# Altium schematic symbol library Regulator_Linear.SchLib: 1538 symbols (part 3 of 9)
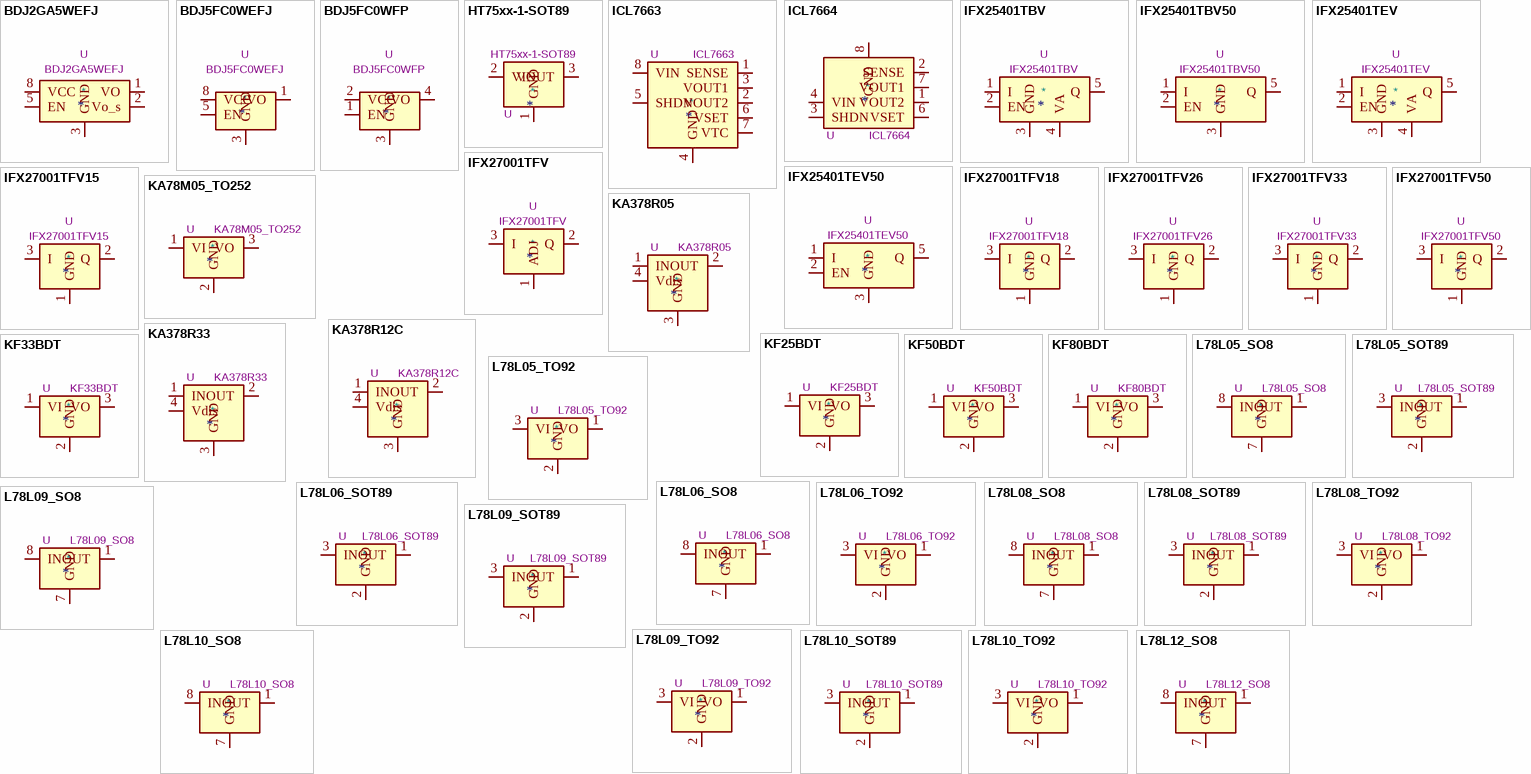
[diagram p40: symbols BDJ2GA5WEFJ to L78L12_SO8]

## L78L09_SOT89
designator *  value L78L09_SOT89  Reference: U
ki_keywords: Voltage Regulator 100mA Positive; ki_description: Positive 100mA 30V Linear Regulator, Fixed Output 9V, SOT-89; ki_fp_filters: SOT?89*; Footprint: Package_TO_SOT_SMD:SOT-89-3; Datasheet: http://www.st.com/content/ccc/resource/technical/document/datasheet/15/55/e5/aa/23/5b/43/fd/CD00000446.pdf/files/CD00000446.pdf/jcr:content/translations/en.CD00000446.pdf
pins: 1 OUT, 2 GND, 3 IN

## L78L09_TO92
designator *  value L78L09_TO92  Reference: U
ki_keywords: Voltage Regulator 100mA Positive; ki_description: Positive 100mA 30V Linear Regulator, Fixed Output 9V, TO-92; ki_fp_filters: TO?92*; Footprint: Package_TO_SOT_THT:TO-92_Inline; Datasheet: http://www.st.com/content/ccc/resource/technical/document/datasheet/15/55/e5/aa/23/5b/43/fd/CD00000446.pdf/files/CD00000446.pdf/jcr:content/translations/en.CD00000446.pdf
pins: 1 VO, 2 GND, 3 VI

## L78L10_SO8
designator *  value L78L10_SO8  Reference: U
ki_keywords: Voltage Regulator 100mA Positive; ki_description: Positive 100mA 30V Linear Regulator, Fixed Output 10V, SO-8; ki_fp_filters: SOIC*3.9x4.9mm*P1.27mm*; Footprint: Package_SO:SOIC-8_3.9x4.9mm_P1.27mm; Datasheet: http://www.st.com/content/ccc/resource/technical/document/datasheet/15/55/e5/aa/23/5b/43/fd/CD00000446.pdf/files/CD00000446.pdf/jcr:content/translations/en.CD00000446.pdf
pins: 1 OUT, 2 GND hidden, 3 GND hidden, 4 NC hidden, 5 NC hidden, 6 GND hidden, 7 GND, 8 IN

## L78L10_SOT89
designator *  value L78L10_SOT89  Reference: U
ki_keywords: Voltage Regulator 100mA Positive; ki_description: Positive 100mA 30V Linear Regulator, Fixed Output 10V, SOT-89; ki_fp_filters: SOT?89*; Footprint: Package_TO_SOT_SMD:SOT-89-3; Datasheet: http://www.st.com/content/ccc/resource/technical/document/datasheet/15/55/e5/aa/23/5b/43/fd/CD00000446.pdf/files/CD00000446.pdf/jcr:content/translations/en.CD00000446.pdf
pins: 1 OUT, 2 GND, 3 IN

## L78L10_TO92
designator *  value L78L10_TO92  Reference: U
ki_keywords: Voltage Regulator 100mA Positive; ki_description: Positive 100mA 30V Linear Regulator, Fixed Output 10V, TO-92; ki_fp_filters: TO?92*; Footprint: Package_TO_SOT_THT:TO-92_Inline; Datasheet: http://www.st.com/content/ccc/resource/technical/document/datasheet/15/55/e5/aa/23/5b/43/fd/CD00000446.pdf/files/CD00000446.pdf/jcr:content/translations/en.CD00000446.pdf
pins: 1 VO, 2 GND, 3 VI

## L78L12_SO8
designator *  value L78L12_SO8  Reference: U
ki_keywords: Voltage Regulator 100mA Positive; ki_description: Positive 100mA 30V Linear Regulator, Fixed Output 12V, SO-8; ki_fp_filters: SOIC*3.9x4.9mm*P1.27mm*; Footprint: Package_SO:SOIC-8_3.9x4.9mm_P1.27mm; Datasheet: http://www.st.com/content/ccc/resource/technical/document/datasheet/15/55/e5/aa/23/5b/43/fd/CD00000446.pdf/files/CD00000446.pdf/jcr:content/translations/en.CD00000446.pdf
pins: 1 OUT, 2 GND hidden, 3 GND hidden, 4 NC hidden, 5 NC hidden, 6 GND hidden, 7 GND, 8 IN

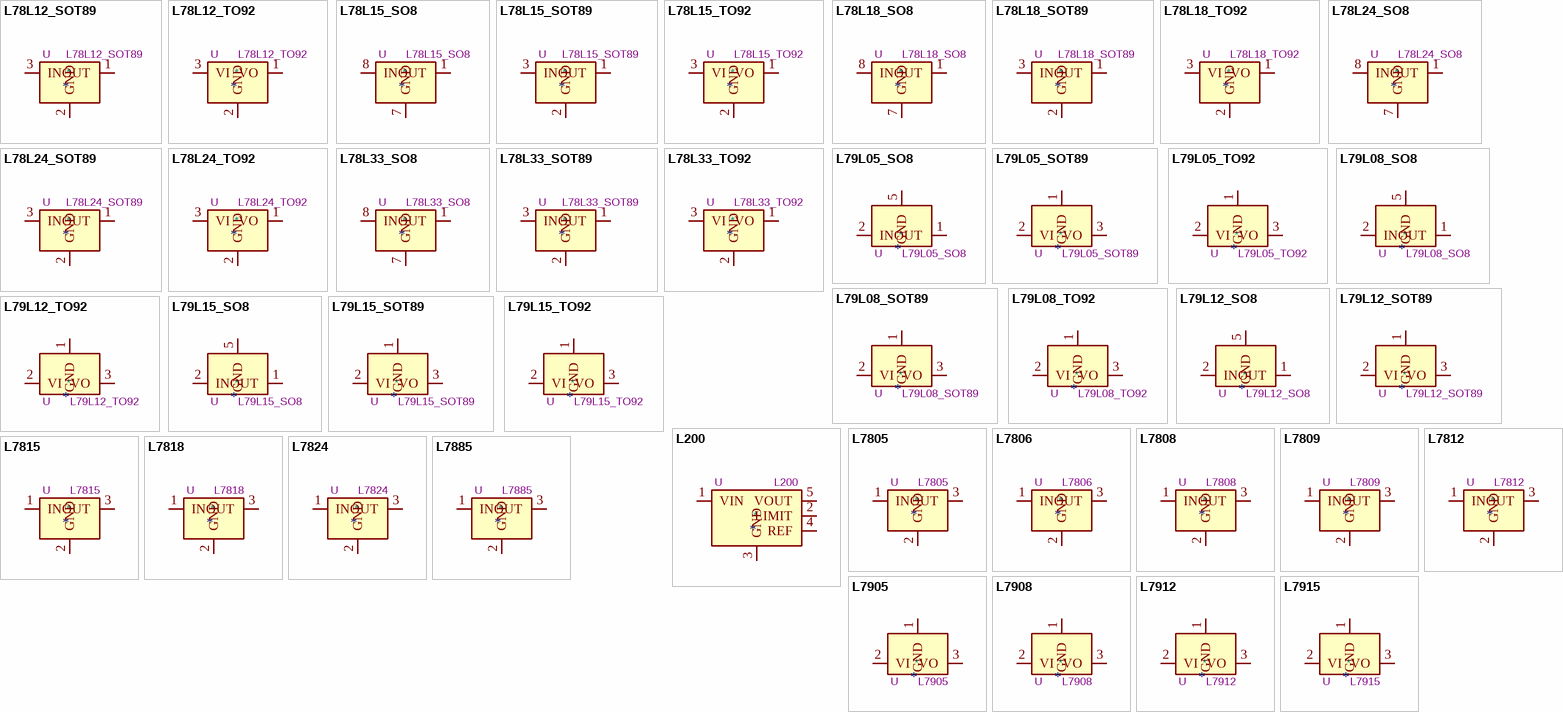
[diagram p9: symbols L78L12_SOT89 to L7915]

## L78L12_SOT89
designator *  value L78L12_SOT89  Reference: U
ki_keywords: Voltage Regulator 100mA Positive; ki_description: Positive 100mA 30V Linear Regulator, Fixed Output 12V, SOT-89; ki_fp_filters: SOT?89*; Footprint: Package_TO_SOT_SMD:SOT-89-3; Datasheet: http://www.st.com/content/ccc/resource/technical/document/datasheet/15/55/e5/aa/23/5b/43/fd/CD00000446.pdf/files/CD00000446.pdf/jcr:content/translations/en.CD00000446.pdf
pins: 1 OUT, 2 GND, 3 IN

## L78L12_TO92
designator *  value L78L12_TO92  Reference: U
ki_keywords: Voltage Regulator 100mA Positive; ki_description: Positive 100mA 30V Linear Regulator, Fixed Output 12V, TO-92; ki_fp_filters: TO?92*; Footprint: Package_TO_SOT_THT:TO-92_Inline; Datasheet: http://www.st.com/content/ccc/resource/technical/document/datasheet/15/55/e5/aa/23/5b/43/fd/CD00000446.pdf/files/CD00000446.pdf/jcr:content/translations/en.CD00000446.pdf
pins: 1 VO, 2 GND, 3 VI

## L78L15_SO8
designator *  value L78L15_SO8  Reference: U
ki_keywords: Voltage Regulator 100mA Positive; ki_description: Positive 100mA 30V Linear Regulator, Fixed Output 15V, SO-8; ki_fp_filters: SOIC*3.9x4.9mm*P1.27mm*; Footprint: Package_SO:SOIC-8_3.9x4.9mm_P1.27mm; Datasheet: http://www.st.com/content/ccc/resource/technical/document/datasheet/15/55/e5/aa/23/5b/43/fd/CD00000446.pdf/files/CD00000446.pdf/jcr:content/translations/en.CD00000446.pdf
pins: 1 OUT, 2 GND hidden, 3 GND hidden, 4 NC hidden, 5 NC hidden, 6 GND hidden, 7 GND, 8 IN

## L78L15_SOT89
designator *  value L78L15_SOT89  Reference: U
ki_keywords: Voltage Regulator 100mA Positive; ki_description: Positive 100mA 30V Linear Regulator, Fixed Output 15V, SOT-89; ki_fp_filters: SOT?89*; Footprint: Package_TO_SOT_SMD:SOT-89-3; Datasheet: http://www.st.com/content/ccc/resource/technical/document/datasheet/15/55/e5/aa/23/5b/43/fd/CD00000446.pdf/files/CD00000446.pdf/jcr:content/translations/en.CD00000446.pdf
pins: 1 OUT, 2 GND, 3 IN

## L78L15_TO92
designator *  value L78L15_TO92  Reference: U
ki_keywords: Voltage Regulator 100mA Positive; ki_description: Positive 100mA 30V Linear Regulator, Fixed Output 15V, TO-92; ki_fp_filters: TO?92*; Footprint: Package_TO_SOT_THT:TO-92_Inline; Datasheet: http://www.st.com/content/ccc/resource/technical/document/datasheet/15/55/e5/aa/23/5b/43/fd/CD00000446.pdf/files/CD00000446.pdf/jcr:content/translations/en.CD00000446.pdf
pins: 1 VO, 2 GND, 3 VI

## L78L18_SO8
designator *  value L78L18_SO8  Reference: U
ki_keywords: Voltage Regulator 100mA Positive; ki_description: Positive 100mA 30V Linear Regulator, Fixed Output 18V, SO-8; ki_fp_filters: SOIC*3.9x4.9mm*P1.27mm*; Footprint: Package_SO:SOIC-8_3.9x4.9mm_P1.27mm; Datasheet: http://www.st.com/content/ccc/resource/technical/document/datasheet/15/55/e5/aa/23/5b/43/fd/CD00000446.pdf/files/CD00000446.pdf/jcr:content/translations/en.CD00000446.pdf
pins: 1 OUT, 2 GND hidden, 3 GND hidden, 4 NC hidden, 5 NC hidden, 6 GND hidden, 7 GND, 8 IN

## L78L18_SOT89
designator *  value L78L18_SOT89  Reference: U
ki_keywords: Voltage Regulator 100mA Positive; ki_description: Positive 100mA 30V Linear Regulator, Fixed Output 18V, SOT-89; ki_fp_filters: SOT?89*; Footprint: Package_TO_SOT_SMD:SOT-89-3; Datasheet: http://www.st.com/content/ccc/resource/technical/document/datasheet/15/55/e5/aa/23/5b/43/fd/CD00000446.pdf/files/CD00000446.pdf/jcr:content/translations/en.CD00000446.pdf
pins: 1 OUT, 2 GND, 3 IN

## L78L18_TO92
designator *  value L78L18_TO92  Reference: U
ki_keywords: Voltage Regulator 100mA Positive; ki_description: Positive 100mA 30V Linear Regulator, Fixed Output 18V, TO-92; ki_fp_filters: TO?92*; Footprint: Package_TO_SOT_THT:TO-92_Inline; Datasheet: http://www.st.com/content/ccc/resource/technical/document/datasheet/15/55/e5/aa/23/5b/43/fd/CD00000446.pdf/files/CD00000446.pdf/jcr:content/translations/en.CD00000446.pdf
pins: 1 VO, 2 GND, 3 VI

## L78L24_SO8
designator *  value L78L24_SO8  Reference: U
ki_keywords: Voltage Regulator 100mA Positive; ki_description: Positive 100mA 30V Linear Regulator, Fixed Output 24V, SO-8; ki_fp_filters: SOIC*3.9x4.9mm*P1.27mm*; Footprint: Package_SO:SOIC-8_3.9x4.9mm_P1.27mm; Datasheet: http://www.st.com/content/ccc/resource/technical/document/datasheet/15/55/e5/aa/23/5b/43/fd/CD00000446.pdf/files/CD00000446.pdf/jcr:content/translations/en.CD00000446.pdf
pins: 1 OUT, 2 GND hidden, 3 GND hidden, 4 NC hidden, 5 NC hidden, 6 GND hidden, 7 GND, 8 IN

## L78L24_SOT89
designator *  value L78L24_SOT89  Reference: U
ki_keywords: Voltage Regulator 100mA Positive; ki_description: Positive 100mA 30V Linear Regulator, Fixed Output 24V, SOT-89; ki_fp_filters: SOT?89*; Footprint: Package_TO_SOT_SMD:SOT-89-3; Datasheet: http://www.st.com/content/ccc/resource/technical/document/datasheet/15/55/e5/aa/23/5b/43/fd/CD00000446.pdf/files/CD00000446.pdf/jcr:content/translations/en.CD00000446.pdf
pins: 1 OUT, 2 GND, 3 IN

## L78L24_TO92
designator *  value L78L24_TO92  Reference: U
ki_keywords: Voltage Regulator 100mA Positive; ki_description: Positive 100mA 30V Linear Regulator, Fixed Output 24V, TO-92; ki_fp_filters: TO?92*; Footprint: Package_TO_SOT_THT:TO-92_Inline; Datasheet: http://www.st.com/content/ccc/resource/technical/document/datasheet/15/55/e5/aa/23/5b/43/fd/CD00000446.pdf/files/CD00000446.pdf/jcr:content/translations/en.CD00000446.pdf
pins: 1 VO, 2 GND, 3 VI

## L78L33_SO8
designator *  value L78L33_SO8  Reference: U
ki_keywords: Voltage Regulator 100mA Positive; ki_description: Positive 100mA 30V Linear Regulator, Fixed Output 3.3V, SO-8; ki_fp_filters: SOIC*3.9x4.9mm*P1.27mm*; Footprint: Package_SO:SOIC-8_3.9x4.9mm_P1.27mm; Datasheet: http://www.st.com/content/ccc/resource/technical/document/datasheet/15/55/e5/aa/23/5b/43/fd/CD00000446.pdf/files/CD00000446.pdf/jcr:content/translations/en.CD00000446.pdf
pins: 1 OUT, 2 GND hidden, 3 GND hidden, 4 NC hidden, 5 NC hidden, 6 GND hidden, 7 GND, 8 IN

## L78L33_SOT89
designator *  value L78L33_SOT89  Reference: U
ki_keywords: Voltage Regulator 100mA Positive; ki_description: Positive 100mA 30V Linear Regulator, Fixed Output 3.3V, SOT-89; ki_fp_filters: SOT?89*; Footprint: Package_TO_SOT_SMD:SOT-89-3; Datasheet: http://www.st.com/content/ccc/resource/technical/document/datasheet/15/55/e5/aa/23/5b/43/fd/CD00000446.pdf/files/CD00000446.pdf/jcr:content/translations/en.CD00000446.pdf
pins: 1 OUT, 2 GND, 3 IN

## L78L33_TO92
designator *  value L78L33_TO92  Reference: U
ki_keywords: Voltage Regulator 100mA Positive; ki_description: Positive 100mA 30V Linear Regulator, Fixed Output 3.3V, TO-92; ki_fp_filters: TO?92*; Footprint: Package_TO_SOT_THT:TO-92_Inline; Datasheet: http://www.st.com/content/ccc/resource/technical/document/datasheet/15/55/e5/aa/23/5b/43/fd/CD00000446.pdf/files/CD00000446.pdf/jcr:content/translations/en.CD00000446.pdf
pins: 1 VO, 2 GND, 3 VI

## L79L05_SO8
designator *  value L79L05_SO8  Reference: U
ki_keywords: Voltage Regulator 100mA Negative; ki_description: Negative 100mA -30V Linear Regulator, Fixed Output -5V, SO-8; ki_fp_filters: SOIC?8*3.9x4.9mm*P1.27mm*; Footprint: Package_SO:SOIC-8_3.9x4.9mm_P1.27mm; Datasheet: http://www.farnell.com/datasheets/1827870.pdf
pins: 1 OUT, 2 IN, 3 IN hidden, 4 NC hidden, 5 GND, 6 IN hidden, 7 IN hidden, 8 NC hidden

## L79L05_SOT89
designator *  value L79L05_SOT89  Reference: U
ki_keywords: Voltage Regulator 100mA Negative; ki_description: Negative 100mA -30V Linear Regulator, Fixed Output -5V, SOT-89; ki_fp_filters: SOT?89*; Footprint: Package_TO_SOT_SMD:SOT-89-3; Datasheet: http://www.farnell.com/datasheets/1827870.pdf
pins: 1 GND, 2 VI, 3 VO

## L79L05_TO92
designator *  value L79L05_TO92  Reference: U
ki_keywords: Voltage Regulator 100mA Negative; ki_description: Negative 100mA -30V Linear Regulator, Fixed Output -5V, TO-92; ki_fp_filters: TO?92*; Footprint: Package_TO_SOT_THT:TO-92_Inline; Datasheet: http://www.farnell.com/datasheets/1827870.pdf
pins: 1 GND, 2 VI, 3 VO

## L79L08_SO8
designator *  value L79L08_SO8  Reference: U
ki_keywords: Voltage Regulator 100mA Negative; ki_description: Negative 100mA -30V Linear Regulator, Fixed Output -5V, SO-8; ki_fp_filters: SOIC?8*3.9x4.9mm*P1.27mm*; Footprint: Package_SO:SOIC-8_3.9x4.9mm_P1.27mm; Datasheet: http://www.farnell.com/datasheets/1827870.pdf
pins: 1 OUT, 2 IN, 3 IN hidden, 4 NC hidden, 5 GND, 6 IN hidden, 7 IN hidden, 8 NC hidden

## L79L08_SOT89
designator *  value L79L08_SOT89  Reference: U
ki_keywords: Voltage Regulator 100mA Negative; ki_description: Negative 100mA -30V Linear Regulator, Fixed Output -5V, SOT-89; ki_fp_filters: SOT?89*; Footprint: Package_TO_SOT_SMD:SOT-89-3; Datasheet: http://www.farnell.com/datasheets/1827870.pdf
pins: 1 GND, 2 VI, 3 VO

## L79L08_TO92
designator *  value L79L08_TO92  Reference: U
ki_keywords: Voltage Regulator 100mA Negative; ki_description: Negative 100mA -30V Linear Regulator, Fixed Output -5V, TO-92; ki_fp_filters: TO?92*; Footprint: Package_TO_SOT_THT:TO-92_Inline; Datasheet: http://www.farnell.com/datasheets/1827870.pdf
pins: 1 GND, 2 VI, 3 VO

## L79L12_SO8
designator *  value L79L12_SO8  Reference: U
ki_keywords: Voltage Regulator 100mA Negative; ki_description: Negative 100mA -30V Linear Regulator, Fixed Output -5V, SO-8; ki_fp_filters: SOIC?8*3.9x4.9mm*P1.27mm*; Footprint: Package_SO:SOIC-8_3.9x4.9mm_P1.27mm; Datasheet: http://www.farnell.com/datasheets/1827870.pdf
pins: 1 OUT, 2 IN, 3 IN hidden, 4 NC hidden, 5 GND, 6 IN hidden, 7 IN hidden, 8 NC hidden

## L79L12_SOT89
designator *  value L79L12_SOT89  Reference: U
ki_keywords: Voltage Regulator 100mA Negative; ki_description: Negative 100mA -30V Linear Regulator, Fixed Output -5V, SOT-89; ki_fp_filters: SOT?89*; Footprint: Package_TO_SOT_SMD:SOT-89-3; Datasheet: http://www.farnell.com/datasheets/1827870.pdf
pins: 1 GND, 2 VI, 3 VO

## L79L12_TO92
designator *  value L79L12_TO92  Reference: U
ki_keywords: Voltage Regulator 100mA Negative; ki_description: Negative 100mA -30V Linear Regulator, Fixed Output -5V, TO-92; ki_fp_filters: TO?92*; Footprint: Package_TO_SOT_THT:TO-92_Inline; Datasheet: http://www.farnell.com/datasheets/1827870.pdf
pins: 1 GND, 2 VI, 3 VO

## L79L15_SO8
designator *  value L79L15_SO8  Reference: U
ki_keywords: Voltage Regulator 100mA Negative; ki_description: Negative 100mA -30V Linear Regulator, Fixed Output -5V, SO-8; ki_fp_filters: SOIC?8*3.9x4.9mm*P1.27mm*; Footprint: Package_SO:SOIC-8_3.9x4.9mm_P1.27mm; Datasheet: http://www.farnell.com/datasheets/1827870.pdf
pins: 1 OUT, 2 IN, 3 IN hidden, 4 NC hidden, 5 GND, 6 IN hidden, 7 IN hidden, 8 NC hidden

## L79L15_SOT89
designator *  value L79L15_SOT89  Reference: U
ki_keywords: Voltage Regulator 100mA Negative; ki_description: Negative 100mA -30V Linear Regulator, Fixed Output -5V, SOT-89; ki_fp_filters: SOT?89*; Footprint: Package_TO_SOT_SMD:SOT-89-3; Datasheet: http://www.farnell.com/datasheets/1827870.pdf
pins: 1 GND, 2 VI, 3 VO

## L79L15_TO92
designator *  value L79L15_TO92  Reference: U
ki_keywords: Voltage Regulator 100mA Negative; ki_description: Negative 100mA -30V Linear Regulator, Fixed Output -5V, TO-92; ki_fp_filters: TO?92*; Footprint: Package_TO_SOT_THT:TO-92_Inline; Datasheet: http://www.farnell.com/datasheets/1827870.pdf
pins: 1 GND, 2 VI, 3 VO

## L200
designator *  value L200  Reference: U
ki_keywords: 2A Regulator Adjustable Positive; ki_description: Adjustable voltage and current regulator, 2A, 36V; ki_fp_filters: TO?220*StaggerOdd*; Footprint: Package_TO_SOT_THT:TO-220-5_P3.4x3.8mm_StaggerOdd_Lead7.13mm_TabDown; Datasheet: http://www.zen22142.zen.co.uk/Circuits/Power/l200.pdf
pins: 1 VIN, 2 LIMIT, 3 GND, 4 REF, 5 VOUT

## L7805
designator *  value L7805  Reference: U
ki_keywords: Voltage Regulator 1.5A Positive; ki_description: Positive 1.5A 35V Linear Regulator, Fixed Output 5V, TO-220/TO-263/TO-252; ki_fp_filters: TO?252* TO?263* TO?220*; Datasheet: http://www.st.com/content/ccc/resource/technical/document/datasheet/41/4f/b3/b0/12/d4/47/88/CD00000444.pdf/files/CD00000444.pdf/jcr:content/translations/en.CD00000444.pdf
pins: 1 IN, 2 GND, 3 OUT

## L7806
designator *  value L7806  Reference: U
ki_keywords: Voltage Regulator 1.5A Positive; ki_description: Positive 1.5A 35V Linear Regulator, Fixed Output 6V, TO-220/TO-263/TO-252; ki_fp_filters: TO?252* TO?263* TO?220*; Datasheet: http://www.st.com/content/ccc/resource/technical/document/datasheet/41/4f/b3/b0/12/d4/47/88/CD00000444.pdf/files/CD00000444.pdf/jcr:content/translations/en.CD00000444.pdf
pins: 1 IN, 2 GND, 3 OUT

## L7808
designator *  value L7808  Reference: U
ki_keywords: Voltage Regulator 1.5A Positive; ki_description: Positive 1.5A 35V Linear Regulator, Fixed Output 8V, TO-220/TO-263/TO-252; ki_fp_filters: TO?252* TO?263* TO?220*; Datasheet: http://www.st.com/content/ccc/resource/technical/document/datasheet/41/4f/b3/b0/12/d4/47/88/CD00000444.pdf/files/CD00000444.pdf/jcr:content/translations/en.CD00000444.pdf
pins: 1 IN, 2 GND, 3 OUT

## L7809
designator *  value L7809  Reference: U
ki_keywords: Voltage Regulator 1.5A Positive; ki_description: Positive 1.5A 35V Linear Regulator, Fixed Output 9V, TO-220/TO-263/TO-252; ki_fp_filters: TO?252* TO?263* TO?220*; Datasheet: http://www.st.com/content/ccc/resource/technical/document/datasheet/41/4f/b3/b0/12/d4/47/88/CD00000444.pdf/files/CD00000444.pdf/jcr:content/translations/en.CD00000444.pdf
pins: 1 IN, 2 GND, 3 OUT

## L7812
designator *  value L7812  Reference: U
ki_keywords: Voltage Regulator 1.5A Positive; ki_description: Positive 1.5A 35V Linear Regulator, Fixed Output 12V, TO-220/TO-263/TO-252; ki_fp_filters: TO?252* TO?263* TO?220*; Datasheet: http://www.st.com/content/ccc/resource/technical/document/datasheet/41/4f/b3/b0/12/d4/47/88/CD00000444.pdf/files/CD00000444.pdf/jcr:content/translations/en.CD00000444.pdf
pins: 1 IN, 2 GND, 3 OUT

## L7815
designator *  value L7815  Reference: U
ki_keywords: Voltage Regulator 1.5A Positive; ki_description: Positive 1.5A 35V Linear Regulator, Fixed Output 15V, TO-220/TO-263/TO-252; ki_fp_filters: TO?252* TO?263* TO?220*; Datasheet: http://www.st.com/content/ccc/resource/technical/document/datasheet/41/4f/b3/b0/12/d4/47/88/CD00000444.pdf/files/CD00000444.pdf/jcr:content/translations/en.CD00000444.pdf
pins: 1 IN, 2 GND, 3 OUT

## L7818
designator *  value L7818  Reference: U
ki_keywords: Voltage Regulator 1.5A Positive; ki_description: Positive 1.5A 35V Linear Regulator, Fixed Output 18V, TO-220/TO-263/TO-252; ki_fp_filters: TO?252* TO?263* TO?220*; Datasheet: http://www.st.com/content/ccc/resource/technical/document/datasheet/41/4f/b3/b0/12/d4/47/88/CD00000444.pdf/files/CD00000444.pdf/jcr:content/translations/en.CD00000444.pdf
pins: 1 IN, 2 GND, 3 OUT

## L7824
designator *  value L7824  Reference: U
ki_keywords: Voltage Regulator 1.5A Positive; ki_description: Positive 1.5A 40V Linear Regulator, Fixed Output 24V, TO-220/TO-263/TO-252; ki_fp_filters: TO?252* TO?263* TO?220*; Datasheet: http://www.st.com/content/ccc/resource/technical/document/datasheet/41/4f/b3/b0/12/d4/47/88/CD00000444.pdf/files/CD00000444.pdf/jcr:content/translations/en.CD00000444.pdf
pins: 1 IN, 2 GND, 3 OUT

## L7885
designator *  value L7885  Reference: U
ki_keywords: Voltage Regulator 1.5A Positive; ki_description: Positive 1.5A 35V Linear Regulator, Fixed Output 8.5V, TO-220/TO-263/TO-252; ki_fp_filters: TO?252* TO?263* TO?220*; Datasheet: http://www.st.com/content/ccc/resource/technical/document/datasheet/41/4f/b3/b0/12/d4/47/88/CD00000444.pdf/files/CD00000444.pdf/jcr:content/translations/en.CD00000444.pdf
pins: 1 IN, 2 GND, 3 OUT

## L7905
designator *  value L7905  Reference: U
ki_keywords: Voltage Regulator 1.5A Negative; ki_description: Negative 1.5A 35V Linear Regulator, Fixed Output -5V, TO-220/TO-263; ki_fp_filters: TO?220* TO?263*; Datasheet: http://www.st.com/content/ccc/resource/technical/document/datasheet/c9/16/86/41/c7/2b/45/f2/CD00000450.pdf/files/CD00000450.pdf/jcr:content/translations/en.CD00000450.pdf
pins: 1 GND, 2 VI, 3 VO

## L7908
designator *  value L7908  Reference: U
ki_keywords: Voltage Regulator 1.5A Negative; ki_description: Negative 1.5A 35V Linear Regulator, Fixed Output -8V, TO-220/TO-263; ki_fp_filters: TO?220* TO?263*; Datasheet: http://www.st.com/content/ccc/resource/technical/document/datasheet/c9/16/86/41/c7/2b/45/f2/CD00000450.pdf/files/CD00000450.pdf/jcr:content/translations/en.CD00000450.pdf
pins: 1 GND, 2 VI, 3 VO

## L7912
designator *  value L7912  Reference: U
ki_keywords: Voltage Regulator 1.5A Negative; ki_description: Negative 1.5A 35V Linear Regulator, Fixed Output -12V, TO-220/TO-263; ki_fp_filters: TO?220* TO?263*; Datasheet: http://www.st.com/content/ccc/resource/technical/document/datasheet/c9/16/86/41/c7/2b/45/f2/CD00000450.pdf/files/CD00000450.pdf/jcr:content/translations/en.CD00000450.pdf
pins: 1 GND, 2 VI, 3 VO

## L7915
designator *  value L7915  Reference: U
ki_keywords: Voltage Regulator 1.5A Negative; ki_description: Negative 1.5A 35V Linear Regulator, Fixed Output -15V, TO-220/TO-263; ki_fp_filters: TO?220* TO?263*; Datasheet: http://www.st.com/content/ccc/resource/technical/document/datasheet/c9/16/86/41/c7/2b/45/f2/CD00000450.pdf/files/CD00000450.pdf/jcr:content/translations/en.CD00000450.pdf
pins: 1 GND, 2 VI, 3 VO

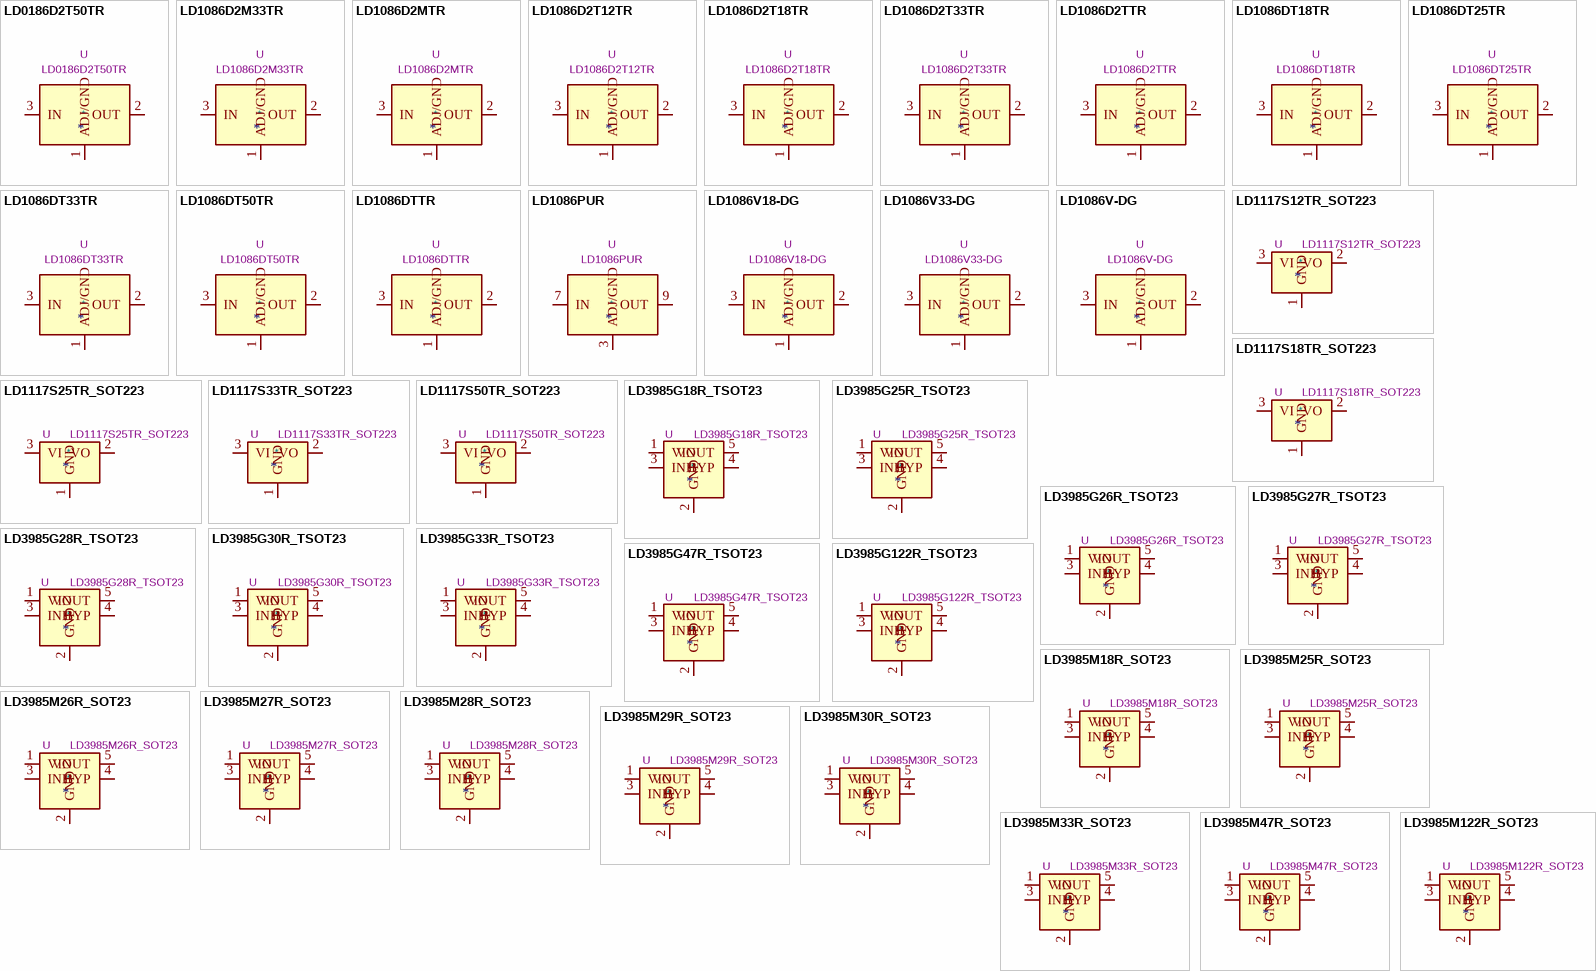
[diagram p10: symbols LD0186D2T50TR to LD3985M122R_SOT23]

## LD0186D2T50TR
designator *  value LD0186D2T50TR  Reference: U
ki_keywords: Linear Regulator 1.5A Fixed Output; ki_description: Positive, 1.5A 30V, Linear Regulator, Fixed Output 5V, TO-263; ki_fp_filters: TO?263?2*; Footprint: Package_TO_SOT_SMD:TO-263-2; Datasheet: https://www.st.com/resource/en/datasheet/ld1086.pdf
pins: 1 ADJ/GND, 2 OUT, 3 IN

## LD1086D2M33TR
designator *  value LD1086D2M33TR  Reference: U
ki_keywords: Linear Regulator 1.5A Fixed Output; ki_description: Positive, 1.5A 30V, Linear Regulator, Fixed Output 3.3V, TO-263; ki_fp_filters: TO?263*TabPin2*; Footprint: Package_TO_SOT_SMD:TO-263-3_TabPin2; Datasheet: https://www.st.com/resource/en/datasheet/ld1086.pdf
pins: 1 ADJ/GND, 2 OUT, 3 IN

## LD1086D2MTR
designator *  value LD1086D2MTR  Reference: U
ki_keywords: Linear Regulator 1.5A Adjustable; ki_description: Positive, 1.5A 30V, Linear Regulator, Adjustable TO-263; ki_fp_filters: TO?263*TabPin2*; Footprint: Package_TO_SOT_SMD:TO-263-3_TabPin2; Datasheet: https://www.st.com/resource/en/datasheet/ld1086.pdf
pins: 1 ADJ/GND, 2 OUT, 3 IN

## LD1086D2T12TR
designator *  value LD1086D2T12TR  Reference: U
ki_keywords: Linear Regulator 1.5A Fixed Output; ki_description: Positive, 1.5A 30V, Linear Regulator, Fixed Output 12V, TO-263; ki_fp_filters: TO?263?2*; Footprint: Package_TO_SOT_SMD:TO-263-2; Datasheet: https://www.st.com/resource/en/datasheet/ld1086.pdf
pins: 1 ADJ/GND, 2 OUT, 3 IN

## LD1086D2T18TR
designator *  value LD1086D2T18TR  Reference: U
ki_keywords: Linear Regulator 1.5A Fixed Output; ki_description: Positive, 1.5A 30V, Linear Regulator, Fixed Output 1.8V, TO-263; ki_fp_filters: TO?263?2*; Footprint: Package_TO_SOT_SMD:TO-263-2; Datasheet: https://www.st.com/resource/en/datasheet/ld1086.pdf
pins: 1 ADJ/GND, 2 OUT, 3 IN

## LD1086D2T33TR
designator *  value LD1086D2T33TR  Reference: U
ki_keywords: Linear Regulator 1.5A Fixed Output; ki_description: Positive, 1.5A 30V, Linear Regulator, Fixed Output 3.3V, TO-263; ki_fp_filters: TO?263?2*; Footprint: Package_TO_SOT_SMD:TO-263-2; Datasheet: https://www.st.com/resource/en/datasheet/ld1086.pdf
pins: 1 ADJ/GND, 2 OUT, 3 IN

## LD1086D2TTR
designator *  value LD1086D2TTR  Reference: U
ki_keywords: Linear Regulator 1.5A Adjustable; ki_description: Positive, 1.5A 30V, Linear Regulator, Adjustable, TO-263; ki_fp_filters: TO?263?2*; Footprint: Package_TO_SOT_SMD:TO-263-2; Datasheet: https://www.st.com/resource/en/datasheet/ld1086.pdf
pins: 1 ADJ/GND, 2 OUT, 3 IN

## LD1086DT18TR
designator *  value LD1086DT18TR  Reference: U
ki_keywords: Linear Regulator 1.5A Fixed Output; ki_description: Positive, 1.5A 30V, Linear Regulator, Fixed Output 1.8V, TO-252; ki_fp_filters: TO?252?2*; Footprint: Package_TO_SOT_SMD:TO-252-2; Datasheet: https://www.st.com/resource/en/datasheet/ld1086.pdf
pins: 1 ADJ/GND, 2 OUT, 3 IN

## LD1086DT25TR
designator *  value LD1086DT25TR  Reference: U
ki_keywords: Linear Regulator 1.5A Fixed Output; ki_description: Positive, 1.5A 30V, Linear Regulator, Fixed Output 2.5V, TO-252; ki_fp_filters: TO?252?2*; Footprint: Package_TO_SOT_SMD:TO-252-2; Datasheet: https://www.st.com/resource/en/datasheet/ld1086.pdf
pins: 1 ADJ/GND, 2 OUT, 3 IN

## LD1086DT33TR
designator *  value LD1086DT33TR  Reference: U
ki_keywords: Linear Regulator 1.5A Fixed Output; ki_description: Positive, 1.5A 30V, Linear Regulator, Fixed Output 3.3V, TO-252; ki_fp_filters: TO?252?2*; Footprint: Package_TO_SOT_SMD:TO-252-2; Datasheet: https://www.st.com/resource/en/datasheet/ld1086.pdf
pins: 1 ADJ/GND, 2 OUT, 3 IN

## LD1086DT50TR
designator *  value LD1086DT50TR  Reference: U
ki_keywords: Linear Regulator 1.5A Fixed Output; ki_description: Positive, 1.5A 30V, Linear Regulator, Fixed Output 5V, TO-252; ki_fp_filters: TO?252?2*; Footprint: Package_TO_SOT_SMD:TO-252-2; Datasheet: https://www.st.com/resource/en/datasheet/ld1086.pdf
pins: 1 ADJ/GND, 2 OUT, 3 IN

## LD1086DTTR
designator *  value LD1086DTTR  Reference: U
ki_keywords: Linear Regulator 1.5A Adjustable; ki_description: Positive, 1.5A 30V, Linear Regulator, Adjustable, TO-252; ki_fp_filters: TO?252?2*; Footprint: Package_TO_SOT_SMD:TO-252-2; Datasheet: https://www.st.com/resource/en/datasheet/ld1086.pdf
pins: 1 ADJ/GND, 2 OUT, 3 IN

## LD1086PUR
designator *  value LD1086PUR  Reference: U
ki_keywords: Linear Regulator 1.5A Adjustable; ki_description: Positive, 1.5A 30V, Linear Regulator, Adjustable, DFN8; ki_fp_filters: DFN*1EP*4x4mm*P0.8mm*; Footprint: Package_DFN_QFN:DFN-8-1EP_4x4mm_P0.8mm_EP2.3x3.24mm; Datasheet: https://www.st.com/resource/en/datasheet/ld1086.pdf
pins: 3 ADJ/GND, 7 IN, 8 IN hidden, 9 OUT

## LD1086V18-DG
designator *  value LD1086V18-DG  Reference: U
ki_keywords: Linear Regulator 1.5A Fixed Output; ki_description: Positive, 1.5A 30V, Linear Regulator, Fixed Output 1.8V, TO-220; ki_fp_filters: TO?220*; Footprint: Package_TO_SOT_THT:TO-220-3_Vertical; Datasheet: https://www.st.com/resource/en/datasheet/ld1086.pdf
pins: 1 ADJ/GND, 2 OUT, 3 IN

## LD1086V33-DG
designator *  value LD1086V33-DG  Reference: U
ki_keywords: Linear Regulator 1.5A Fixed Output; ki_description: Positive, 1.5A 30V, Linear Regulator, Fixed Output 3.3V, TO-220; ki_fp_filters: TO?220*; Footprint: Package_TO_SOT_THT:TO-220-3_Vertical; Datasheet: https://www.st.com/resource/en/datasheet/ld1086.pdf
pins: 1 ADJ/GND, 2 OUT, 3 IN

## LD1086V-DG
designator *  value LD1086V-DG  Reference: U
ki_keywords: Linear Regulator 1.5A Adjustable; ki_description: Positive, 1.5A 30V, Linear Regulator, Adjustable, TO-220; ki_fp_filters: TO?220*; Footprint: Package_TO_SOT_THT:TO-220-3_Vertical; Datasheet: https://www.st.com/resource/en/datasheet/ld1086.pdf
pins: 1 ADJ/GND, 2 OUT, 3 IN

## LD1117S12TR_SOT223
designator *  value LD1117S12TR_SOT223  Reference: U
ki_keywords: REGULATOR LDO 1.2V; ki_description: 800mA Fixed Low Drop Positive Voltage Regulator, Fixed Output 1.2V, SOT-223; ki_fp_filters: SOT?223*TabPin2*; Footprint: Package_TO_SOT_SMD:SOT-223-3_TabPin2; Datasheet: http://www.st.com/st-web-ui/static/active/en/resource/technical/document/datasheet/CD00000544.pdf
pins: 1 GND, 2 VO, 3 VI

## LD1117S18TR_SOT223
designator *  value LD1117S18TR_SOT223  Reference: U
ki_keywords: REGULATOR LDO 1.8V; ki_description: 800mA Fixed Low Drop Positive Voltage Regulator, Fixed Output 1.8V, SOT-223; ki_fp_filters: SOT?223*TabPin2*; Footprint: Package_TO_SOT_SMD:SOT-223-3_TabPin2; Datasheet: http://www.st.com/st-web-ui/static/active/en/resource/technical/document/datasheet/CD00000544.pdf
pins: 1 GND, 2 VO, 3 VI

## LD1117S25TR_SOT223
designator *  value LD1117S25TR_SOT223  Reference: U
ki_keywords: REGULATOR LDO 2.5V; ki_description: 800mA Fixed Low Drop Positive Voltage Regulator, Fixed Output 2.5V, SOT-223; ki_fp_filters: SOT?223*TabPin2*; Footprint: Package_TO_SOT_SMD:SOT-223-3_TabPin2; Datasheet: http://www.st.com/st-web-ui/static/active/en/resource/technical/document/datasheet/CD00000544.pdf
pins: 1 GND, 2 VO, 3 VI

## LD1117S33TR_SOT223
designator *  value LD1117S33TR_SOT223  Reference: U
ki_keywords: REGULATOR LDO 3.3V; ki_description: 800mA Fixed Low Drop Positive Voltage Regulator, Fixed Output 3.3V, SOT-223; ki_fp_filters: SOT?223*TabPin2*; Footprint: Package_TO_SOT_SMD:SOT-223-3_TabPin2; Datasheet: http://www.st.com/st-web-ui/static/active/en/resource/technical/document/datasheet/CD00000544.pdf
pins: 1 GND, 2 VO, 3 VI

## LD1117S50TR_SOT223
designator *  value LD1117S50TR_SOT223  Reference: U
ki_keywords: REGULATOR LDO 5.0V; ki_description: 800mA Fixed Low Drop Positive Voltage Regulator, Fixed Output 5.0V, SOT-223; ki_fp_filters: SOT?223*TabPin2*; Footprint: Package_TO_SOT_SMD:SOT-223-3_TabPin2; Datasheet: http://www.st.com/st-web-ui/static/active/en/resource/technical/document/datasheet/CD00000544.pdf
pins: 1 GND, 2 VO, 3 VI

## LD3985G18R_TSOT23
designator *  value LD3985G18R_TSOT23  Reference: U
ki_keywords: 150mA LDO Regulator Fixed Positive; ki_description: 150mA Low Dropout Voltage Regulator, Fixed Output 1.8V, TSOT-23-5; ki_fp_filters: TSOT?23*; Footprint: Package_TO_SOT_SMD:TSOT-23-5; Datasheet: http://www.st.com/internet/com/TECHNICAL_RESOURCES/TECHNICAL_LITERATURE/DATASHEET/CD00003395.pdf
pins: 1 VIN, 2 GND, 3 INH, 4 BYP, 5 VOUT

## LD3985G25R_TSOT23
designator *  value LD3985G25R_TSOT23  Reference: U
ki_keywords: 150mA LDO Regulator Fixed Positive; ki_description: 150mA Low Dropout Voltage Regulator, Fixed Output 2.5V, TSOT-23-5; ki_fp_filters: TSOT?23*; Footprint: Package_TO_SOT_SMD:TSOT-23-5; Datasheet: http://www.st.com/internet/com/TECHNICAL_RESOURCES/TECHNICAL_LITERATURE/DATASHEET/CD00003395.pdf
pins: 1 VIN, 2 GND, 3 INH, 4 BYP, 5 VOUT

## LD3985G26R_TSOT23
designator *  value LD3985G26R_TSOT23  Reference: U
ki_keywords: 150mA LDO Regulator Fixed Positive; ki_description: 150mA Low Dropout Voltage Regulator, Fixed Output 2.6V, TSOT-23-5; ki_fp_filters: TSOT?23*; Footprint: Package_TO_SOT_SMD:TSOT-23-5; Datasheet: http://www.st.com/internet/com/TECHNICAL_RESOURCES/TECHNICAL_LITERATURE/DATASHEET/CD00003395.pdf
pins: 1 VIN, 2 GND, 3 INH, 4 BYP, 5 VOUT

## LD3985G27R_TSOT23
designator *  value LD3985G27R_TSOT23  Reference: U
ki_keywords: 150mA LDO Regulator Fixed Positive; ki_description: 150mA Low Dropout Voltage Regulator, Fixed Output 2.7V, TSOT-23-5; ki_fp_filters: TSOT?23*; Footprint: Package_TO_SOT_SMD:TSOT-23-5; Datasheet: http://www.st.com/internet/com/TECHNICAL_RESOURCES/TECHNICAL_LITERATURE/DATASHEET/CD00003395.pdf
pins: 1 VIN, 2 GND, 3 INH, 4 BYP, 5 VOUT

## LD3985G28R_TSOT23
designator *  value LD3985G28R_TSOT23  Reference: U
ki_keywords: 150mA LDO Regulator Fixed Positive; ki_description: 150mA Low Dropout Voltage Regulator, Fixed Output 2.8V, TSOT-23-5; ki_fp_filters: TSOT?23*; Footprint: Package_TO_SOT_SMD:TSOT-23-5; Datasheet: http://www.st.com/internet/com/TECHNICAL_RESOURCES/TECHNICAL_LITERATURE/DATASHEET/CD00003395.pdf
pins: 1 VIN, 2 GND, 3 INH, 4 BYP, 5 VOUT

## LD3985G30R_TSOT23
designator *  value LD3985G30R_TSOT23  Reference: U
ki_keywords: 150mA LDO Regulator Fixed Positive; ki_description: 150mA Low Dropout Voltage Regulator, Fixed Output 3.0V, TSOT-23-5; ki_fp_filters: TSOT?23*; Footprint: Package_TO_SOT_SMD:TSOT-23-5; Datasheet: http://www.st.com/internet/com/TECHNICAL_RESOURCES/TECHNICAL_LITERATURE/DATASHEET/CD00003395.pdf
pins: 1 VIN, 2 GND, 3 INH, 4 BYP, 5 VOUT

## LD3985G33R_TSOT23
designator *  value LD3985G33R_TSOT23  Reference: U
ki_keywords: 150mA LDO Regulator Fixed Positive; ki_description: 150mA Low Dropout Voltage Regulator, Fixed Output 3.3V, TSOT-23-5; ki_fp_filters: TSOT?23*; Footprint: Package_TO_SOT_SMD:TSOT-23-5; Datasheet: http://www.st.com/internet/com/TECHNICAL_RESOURCES/TECHNICAL_LITERATURE/DATASHEET/CD00003395.pdf
pins: 1 VIN, 2 GND, 3 INH, 4 BYP, 5 VOUT

## LD3985G47R_TSOT23
designator *  value LD3985G47R_TSOT23  Reference: U
ki_keywords: 150mA LDO Regulator Fixed Positive; ki_description: 150mA Low Dropout Voltage Regulator, Fixed Output 4.7V, TSOT-23-5; ki_fp_filters: TSOT?23*; Footprint: Package_TO_SOT_SMD:TSOT-23-5; Datasheet: http://www.st.com/internet/com/TECHNICAL_RESOURCES/TECHNICAL_LITERATURE/DATASHEET/CD00003395.pdf
pins: 1 VIN, 2 GND, 3 INH, 4 BYP, 5 VOUT

## LD3985G122R_TSOT23
designator *  value LD3985G122R_TSOT23  Reference: U
ki_keywords: 150mA LDO Regulator Fixed Positive; ki_description: 150mA Low Dropout Voltage Regulator, Fixed Output 1.22V, TSOT-23-5; ki_fp_filters: TSOT?23*; Footprint: Package_TO_SOT_SMD:TSOT-23-5; Datasheet: http://www.st.com/internet/com/TECHNICAL_RESOURCES/TECHNICAL_LITERATURE/DATASHEET/CD00003395.pdf
pins: 1 VIN, 2 GND, 3 INH, 4 BYP, 5 VOUT

## LD3985M18R_SOT23
designator *  value LD3985M18R_SOT23  Reference: U
ki_keywords: 150mA LDO Regulator Fixed Positive; ki_description: 150mA Low Dropout Voltage Regulator, Fixed Output 1.8V, SOT-23-5; ki_fp_filters: SOT?23*; Footprint: Package_TO_SOT_SMD:SOT-23-5; Datasheet: http://www.st.com/internet/com/TECHNICAL_RESOURCES/TECHNICAL_LITERATURE/DATASHEET/CD00003395.pdf
pins: 1 VIN, 2 GND, 3 INH, 4 BYP, 5 VOUT

## LD3985M25R_SOT23
designator *  value LD3985M25R_SOT23  Reference: U
ki_keywords: 150mA LDO Regulator Fixed Positive; ki_description: 150mA Low Dropout Voltage Regulator, Fixed Output 2.5V, SOT-23-5; ki_fp_filters: SOT?23*; Footprint: Package_TO_SOT_SMD:SOT-23-5; Datasheet: http://www.st.com/internet/com/TECHNICAL_RESOURCES/TECHNICAL_LITERATURE/DATASHEET/CD00003395.pdf
pins: 1 VIN, 2 GND, 3 INH, 4 BYP, 5 VOUT

## LD3985M26R_SOT23
designator *  value LD3985M26R_SOT23  Reference: U
ki_keywords: 150mA LDO Regulator Fixed Positive; ki_description: 150mA Low Dropout Voltage Regulator, Fixed Output 2.6V, SOT-23-5; ki_fp_filters: SOT?23*; Footprint: Package_TO_SOT_SMD:SOT-23-5; Datasheet: http://www.st.com/internet/com/TECHNICAL_RESOURCES/TECHNICAL_LITERATURE/DATASHEET/CD00003395.pdf
pins: 1 VIN, 2 GND, 3 INH, 4 BYP, 5 VOUT

## LD3985M27R_SOT23
designator *  value LD3985M27R_SOT23  Reference: U
ki_keywords: 150mA LDO Regulator Fixed Positive; ki_description: 150mA Low Dropout Voltage Regulator, Fixed Output 2.7V, SOT-23-5; ki_fp_filters: SOT?23*; Footprint: Package_TO_SOT_SMD:SOT-23-5; Datasheet: http://www.st.com/internet/com/TECHNICAL_RESOURCES/TECHNICAL_LITERATURE/DATASHEET/CD00003395.pdf
pins: 1 VIN, 2 GND, 3 INH, 4 BYP, 5 VOUT

## LD3985M28R_SOT23
designator *  value LD3985M28R_SOT23  Reference: U
ki_keywords: 150mA LDO Regulator Fixed Positive; ki_description: 150mA Low Dropout Voltage Regulator, Fixed Output 2.8V, SOT-23-5; ki_fp_filters: SOT?23*; Footprint: Package_TO_SOT_SMD:SOT-23-5; Datasheet: http://www.st.com/internet/com/TECHNICAL_RESOURCES/TECHNICAL_LITERATURE/DATASHEET/CD00003395.pdf
pins: 1 VIN, 2 GND, 3 INH, 4 BYP, 5 VOUT

## LD3985M29R_SOT23
designator *  value LD3985M29R_SOT23  Reference: U
ki_keywords: 150mA LDO Regulator Fixed Positive; ki_description: 150mA Low Dropout Voltage Regulator, Fixed Output 2.8V, SOT-23-5; ki_fp_filters: SOT?23*; Footprint: Package_TO_SOT_SMD:SOT-23-5; Datasheet: http://www.st.com/internet/com/TECHNICAL_RESOURCES/TECHNICAL_LITERATURE/DATASHEET/CD00003395.pdf
pins: 1 VIN, 2 GND, 3 INH, 4 BYP, 5 VOUT

## LD3985M30R_SOT23
designator *  value LD3985M30R_SOT23  Reference: U
ki_keywords: 150mA LDO Regulator Fixed Positive; ki_description: 150mA Low Dropout Voltage Regulator, Fixed Output 3.0V, SOT-23-5; ki_fp_filters: SOT?23*; Footprint: Package_TO_SOT_SMD:SOT-23-5; Datasheet: http://www.st.com/internet/com/TECHNICAL_RESOURCES/TECHNICAL_LITERATURE/DATASHEET/CD00003395.pdf
pins: 1 VIN, 2 GND, 3 INH, 4 BYP, 5 VOUT

## LD3985M33R_SOT23
designator *  value LD3985M33R_SOT23  Reference: U
ki_keywords: 150mA LDO Regulator Fixed Positive; ki_description: 150mA Low Dropout Voltage Regulator, Fixed Output 3.3V, SOT-23-5; ki_fp_filters: SOT?23*; Footprint: Package_TO_SOT_SMD:SOT-23-5; Datasheet: http://www.st.com/internet/com/TECHNICAL_RESOURCES/TECHNICAL_LITERATURE/DATASHEET/CD00003395.pdf
pins: 1 VIN, 2 GND, 3 INH, 4 BYP, 5 VOUT

## LD3985M47R_SOT23
designator *  value LD3985M47R_SOT23  Reference: U
ki_keywords: 150mA LDO Regulator Fixed Positive; ki_description: 150mA Low Dropout Voltage Regulator, Fixed Output 4.7V, SOT-23-5; ki_fp_filters: SOT?23*; Footprint: Package_TO_SOT_SMD:SOT-23-5; Datasheet: http://www.st.com/internet/com/TECHNICAL_RESOURCES/TECHNICAL_LITERATURE/DATASHEET/CD00003395.pdf
pins: 1 VIN, 2 GND, 3 INH, 4 BYP, 5 VOUT

## LD3985M122R_SOT23
designator *  value LD3985M122R_SOT23  Reference: U
ki_keywords: 150mA LDO Regulator Fixed Positive; ki_description: 150mA Low Dropout Voltage Regulator, Fixed Output 1.22V, SOT-23-5; ki_fp_filters: SOT?23*; Footprint: Package_TO_SOT_SMD:SOT-23-5; Datasheet: http://www.st.com/internet/com/TECHNICAL_RESOURCES/TECHNICAL_LITERATURE/DATASHEET/CD00003395.pdf
pins: 1 VIN, 2 GND, 3 INH, 4 BYP, 5 VOUT
